# Altium schematic symbol library LATTICEPLDS_Library.SchLib: 291 symbols (part 28 of 32)
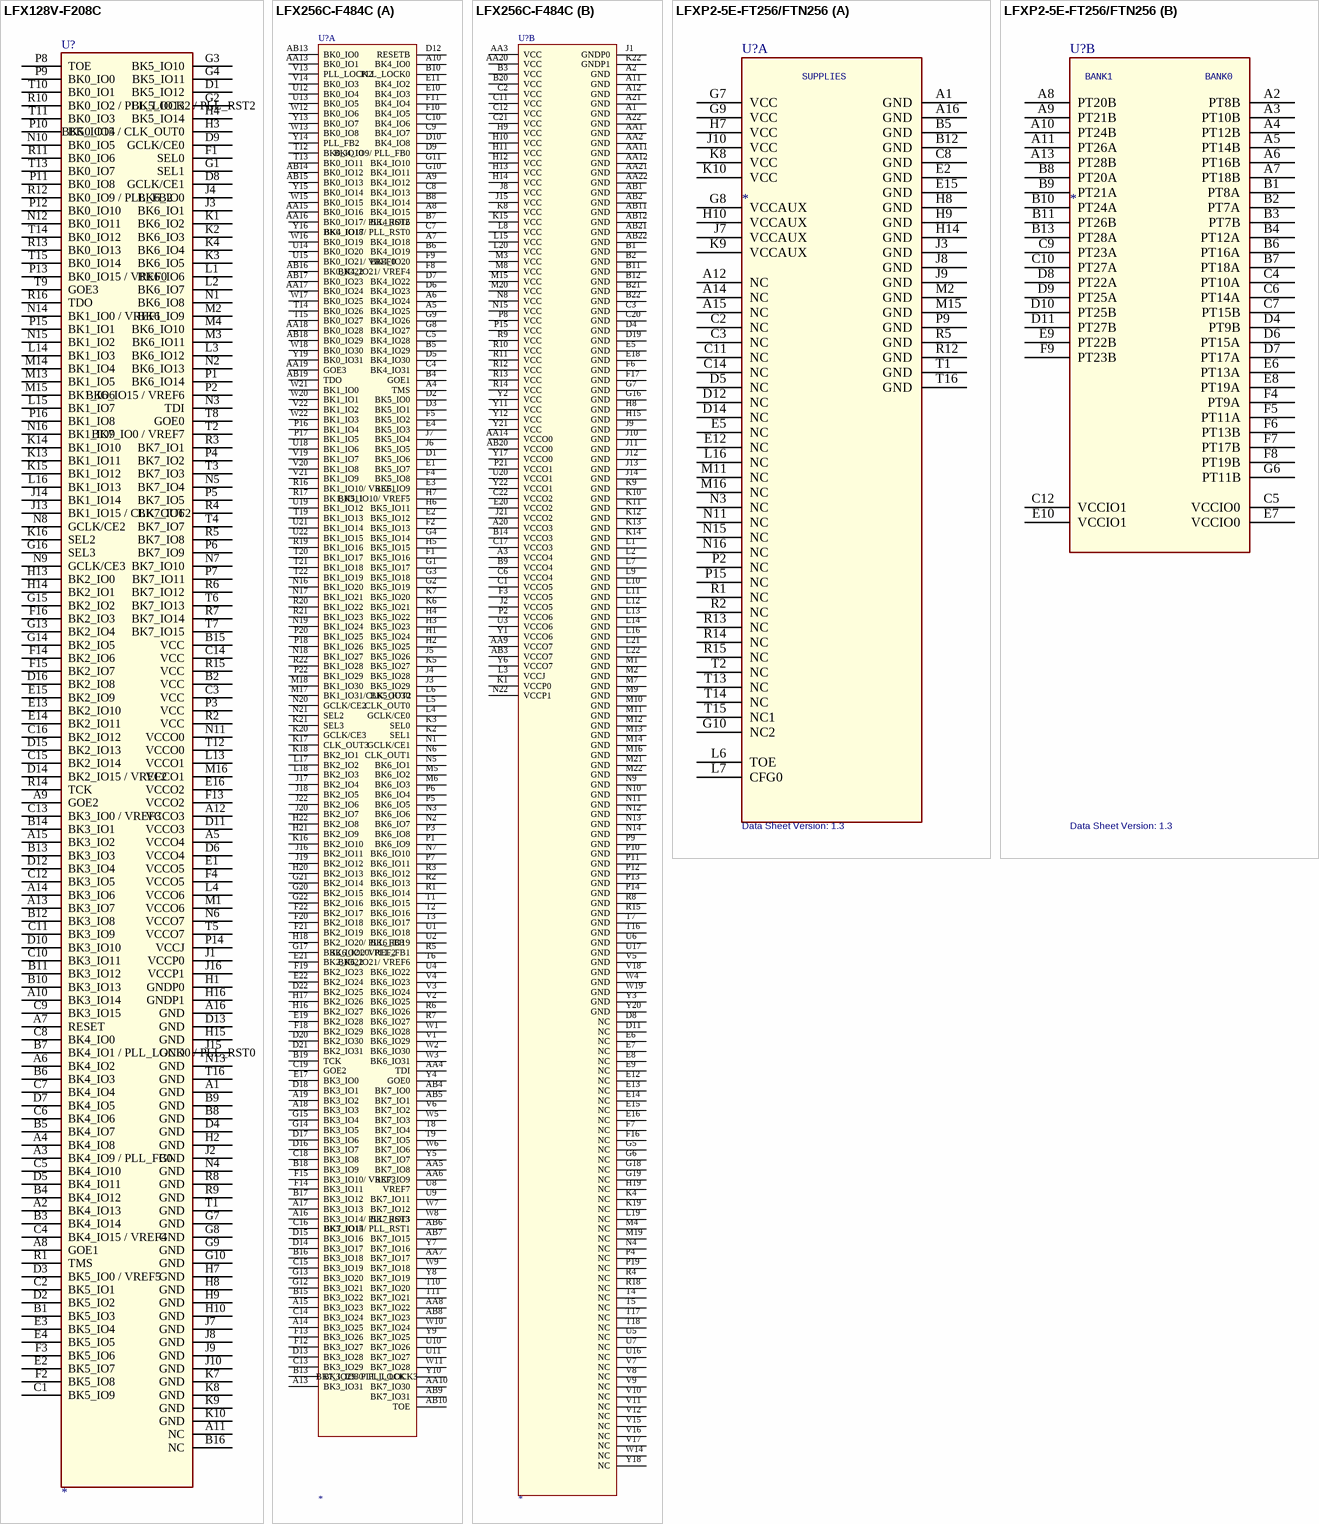
[diagram p330: symbols LFX128V-F208C to LFXP2-5E-FT256/FTN256]

## LFX256C-F484C
designator U?
SPLIT_INST: TRUE; SWAP_INFO: (S1+S2)
part A pins: A4 TMS, A5 BK4_IO25, A6 BK4_IO24, A7 BK4_IO18, A8 BK4_IO15, A9 BK4_IO12, A10 BK4_IO0, A13 BK3_IO31, A14 BK3_IO25, A15 BK3_IO23, A16 BK3_IO14/ PLL_RST3, A17 BK3_IO13, A18 BK3_IO3, A19 BK3_IO2, AA4 TDI, AA5 BK7_IO8, AA6 BK7_IO9, AA7 BK7_IO17, AA8 BK7_IO22, AA10 BK7_IO30, AA13 BK0_IO1, AA15 BK0_IO16, AA16 BK0_IO17/ PLL_RST2, AA17 BK0_IO24, AA18 BK0_IO28, AA19 GOE3, AB4 BK7_IO0, AB5 BK7_IO1, AB6 BK7_IO14/ PLL_RST1, AB7 BK7_IO15, AB8 BK7_IO23, AB9 BK7_IO31, AB10 TOE, AB13 BK0_IO0, AB14 BK0_IO12, AB15 BK0_IO13, AB16 BK0_IO22, AB17 BK0_IO23, AB18 BK0_IO29, AB19 TDO, B4 GOE1, B5 BK4_IO29, B6 BK4_IO19, B7 BK4_IO16, B8 BK4_IO14, B10 PLL_LOCK0, B13 BK3_IO30/ PLL_LOCK3, B15 BK3_IO22, B16 BK3_IO18, B17 BK3_IO12, B18 BK3_IO9, B19 TCK, C4 BK4_IO31, C5 BK4_IO28, C7 BK4_IO17/ PLL_RST0, C8 BK4_IO13, C9 BK4_IO7, C10 BK4_IO6, C13 BK3_IO29, C14 BK3_IO24, C15 BK3_IO19, C16 BK3_IO15, C18 BK3_IO8, C19 GOE2, D1 BK5_IO6, D2 BK5_IO0, D3 BK5_IO1, D5 BK4_IO30, D6 BK4_IO23, D7 BK4_IO22, D9 BK4_IO9/ PLL_FB0, D10 BK4_IO8, D12 RESETB, D13 BK3_IO28, D14 BK3_IO17, D15 BK3_IO16, D16 BK3_IO7, D17 BK3_IO6, D18 BK3_IO1, D20 BK2_IO30, D21 BK2_IO31, D22 BK2_IO25, E1 BK5_IO7, E2 BK5_IO12, E3 BK5_IO9, E4 BK5_IO3, E10 BK4_IO3, E11 BK4_IO2, E17 BK3_IO0, E19 BK2_IO28, E21 BK2_IO22, E22 BK2_IO24, F1 BK5_IO16, F2 BK5_IO13, F4 BK5_IO8, F5 BK5_IO2, F8 BK4_IO21/ VREF4, F9 BK4_IO20, F10 BK4_IO5, F11 BK4_IO4, F12 BK3_IO27, F13 BK3_IO26, F14 BK3_IO11, F15 BK3_IO10/ VREF3, F18 BK2_IO29, F19 BK2_IO23, F20 BK2_IO18, F21 BK2_IO19, F22 BK2_IO17, G1 BK5_IO17, G2 BK5_IO19, G3 BK5_IO18, G4 BK5_IO14, G8 BK4_IO27, G9 BK4_IO26, G10 BK4_IO11, G11 BK4_IO10, G12 BK3_IO21, G13 BK3_IO20, G14 BK3_IO5, G15 BK3_IO4, G17 BK2_IO21/ VREF2, G20 BK2_IO15, G21 BK2_IO14, G22 BK2_IO16, H1 BK5_IO24, H2 BK5_IO25, H3 BK5_IO23, H4 BK5_IO22, H5 BK5_IO15, H6 BK5_IO11, H7 BK5_IO10/ VREF5, H16 BK2_IO27, H17 BK2_IO26, H18 BK2_IO20/ PLL_FB3, H20 BK2_IO13, H21 BK2_IO9, H22 BK2_IO8, J3 BK5_IO29, J4 BK5_IO28, J5 BK5_IO26, J6 BK5_IO5, J7 BK5_IO4, J16 BK2_IO11, J17 BK2_IO4, J18 BK2_IO5, J19 BK2_IO12, J20 BK2_IO7, J22 BK2_IO6, K2 SEL1, K3 SEL0, K5 BK5_IO27, K6 BK5_IO21, K7 BK5_IO20, K16 BK2_IO10, K17 CLK_OUT3, K18 BK2_IO1, K20 GCLK/CE3, K21 SEL3, L4 GCLK/CE0, L5 CLK_OUT0, L6 BK5_IO30, L17 BK2_IO2, L18 BK2_IO3, M5 BK6_IO2, M6 BK6_IO3, M17 BK1_IO31/CLK_OUT2, M18 BK1_IO30, N1 GCLK/CE1, N2 BK6_IO7, N3 BK6_IO6, N5 BK6_IO1, N6 CLK_OUT1, N7 BK6_IO10, N16 BK1_IO20, N17 BK1_IO21, N18 BK1_IO27, N19 BK1_IO24, N20 GCLK/CE2, N21 SEL2, P1 BK6_IO9, P3 BK6_IO8, P5 BK6_IO5, P6 BK6_IO4, P7 BK6_IO11, P16 BK1_IO4, P17 BK1_IO5, P18 BK1_IO26, P20 BK1_IO25, P22 BK1_IO29, R1 BK6_IO14, R2 BK6_IO13, R3 BK6_IO12, R5 BK6_IO20/ PLL_FB1, R6 BK6_IO26, R7 BK6_IO27, R16 BK1_IO10/ VREF1, R17 BK1_IO11, R19 BK1_IO16, R20 BK1_IO22, R21 BK1_IO23, R22 BK1_IO28, T1 BK6_IO15, T2 BK6_IO16, T3 BK6_IO17, T6 BK6_IO21/ VREF6, T8 BK7_IO4, T9 BK7_IO5, T10 BK7_IO20, T11 BK7_IO21, T12 BK0_IO10, T13 BK0_IO11, T14 BK0_IO26, T15 BK0_IO27, T19 BK1_IO13, T20 BK1_IO17, T21 BK1_IO18, T22 BK1_IO19, U1 BK6_IO18, U2 BK6_IO19, U4 BK6_IO22, U8 VREF7, U9 BK7_IO11, U10 BK7_IO26, U11 BK7_IO27, U12 BK0_IO4, U13 BK0_IO5, U14 BK0_IO20, U15 BK0_IO21/ VREF0, U18 BK1_IO6, U19 BK1_IO12, U21 BK1_IO14, U22 BK1_IO15, V1 BK6_IO29, V2 BK6_IO25, V3 BK6_IO24, V4 BK6_IO23, V6 BK7_IO2, V13 PLL_LOCK2, V14 BK0_IO3, V19 BK1_IO7, V20 BK1_IO8, V21 BK1_IO9, V22 BK1_IO2, W1 BK6_IO28, W2 BK6_IO30, W3 BK6_IO31, W5 BK7_IO3, W6 BK7_IO6, W7 BK7_IO12, W8 BK7_IO13, W9 BK7_IO18, W10 BK7_IO24, W11 BK7_IO28, W12 BK0_IO6, W13 BK0_IO8, W15 BK0_IO15, W16 BK0_IO19, W17 BK0_IO25, W18 BK0_IO30, W20 BK1_IO1, W21 BK1_IO0, W22 BK1_IO3, Y4 GOE0, Y5 BK7_IO7, Y7 BK7_IO16, Y8 BK7_IO19, Y9 BK7_IO25, Y10 BK7_IO29/ PLL_LOCK1, Y13 BK0_IO7, Y14 PLL_FB2, Y15 BK0_IO14, Y16 BK0_IO18, Y19 BK0_IO31
part B pins: A1 GND (power), A2 GND (power), A3 VCCO4 (power), A11 GND (power), A12 GND (power), A20 VCCO3 (power), A21 GND (power), A22 GND (power), AA1 GND (power), AA2 GND (power), AA3 VCC (power), AA9 VCCO7 (power), AA11 GND (power), AA12 GND (power), AA14 VCCO0 (power), AA20 VCC (power), AA21 GND (power), AA22 GND (power), AB1 GND (power), AB2 GND (power), AB3 VCCO7 (power), AB11 GND (power), AB12 GND (power), AB20 VCCO0 (power), AB21 GND (power), AB22 GND (power), B1 GND (power), B2 GND (power), B3 VCC (power), B9 VCCO4 (power), B11 GND (power), B12 GND (power), B14 VCCO3 (power), B20 VCC (power), B21 GND (power), B22 GND (power), C1 VCCO5 (power), C2 VCC (power), C3 GND (power), C6 VCCO4 (power), C11 VCC (power), C12 VCC (power), C17 VCCO3 (power), C20 GND (power), C21 VCC (power), C22 VCCO2 (power), D4 GND (power), D8 NC, D11 NC, D19 GND (power), E5 GND (power), E6 NC, E7 NC, E8 NC, E9 NC, E12 NC, E13 NC, E14 NC, E15 NC, E16 NC, E18 GND (power), E20 VCCO2 (power), F3 VCCO5 (power), F6 GND (power), F7 NC, F16 NC, F17 GND (power), G5 NC, G6 NC, G7 GND (power), G16 GND (power), G18 NC, G19 NC, H8 GND (power), H9 VCC (power), H10 VCC (power), H11 VCC (power), H12 VCC (power), H13 VCC (power), H14 VCC (power), H15 GND (power), H19 NC, J1 GNDP0 (power), J2 VCCO5 (power), J8 VCC (power), J9 GND (power), J10 GND (power), J11 GND (power), J12 GND (power), J13 GND (power), J14 GND (power), J15 VCC (power), J21 VCCO2 (power), K1 VCCP0 (power), K4 NC, K8 VCC (power), K9 GND (power), K10 GND (power), K11 GND (power), K12 GND (power), K13 GND (power), K14 GND (power), K15 VCC (power), K19 NC, K22 GNDP1 (power), L1 GND (power), L2 GND (power), L3 VCCJ (power), L7 GND (power), L8 VCC (power), L9 GND (power), L10 GND (power), L11 GND (power), L12 GND (power), L13 GND (power), L14 GND (power), L15 VCC (power), L16 GND (power), L19 NC, L20 VCC (power), L21 GND (power), L22 GND (power), M1 GND (power), M2 GND (power), M3 VCC (power), M4 NC, M7 GND (power), M8 VCC (power), M9 GND (power), M10 GND (power), M11 GND (power), M12 GND (power), M13 GND (power), M14 GND (power), M15 VCC (power), M16 GND (power), M19 NC, M20 VCC (power), M21 GND (power), M22 GND (power), N4 NC, N8 VCC (power), N9 GND (power), N10 GND (power), N11 GND (power), N12 GND (power), N13 GND (power), N14 GND (power), N15 VCC (power), N22 VCCP1 (power), P2 VCCO6 (power), P4 NC, P8 VCC (power), P9 GND (power), P10 GND (power), P11 GND (power), P12 GND (power), P13 GND (power), P14 GND (power), P15 VCC (power), P19 NC, P21 VCCO1 (power), R4 NC, R8 GND (power), R9 VCC (power), R10 VCC (power), R11 VCC (power), R12 VCC (power), R13 VCC (power), R14 VCC (power), R15 GND (power), R18 NC, T4 NC, T5 NC, T7 GND (power), T16 GND (power), T17 NC, T18 NC, U3 VCCO6 (power), U5 NC, U6 GND (power), U7 NC, U16 NC, U17 GND (power), U20 VCCO1 (power), V5 GND (power), V7 NC, V8 NC, V9 NC, V10 NC, V11 NC, V12 NC, V15 NC, V16 NC, V17 NC, V18 GND (power), W4 GND (power), W14 NC, W19 GND (power), Y1 VCCO6 (power), Y2 VCC (power), Y3 GND (power), Y6 VCCO7 (power), Y11 VCC (power), Y12 VCC (power), Y17 VCCO0 (power), Y18 NC, Y20 GND (power), Y21 VCC (power), Y22 VCCO1 (power)

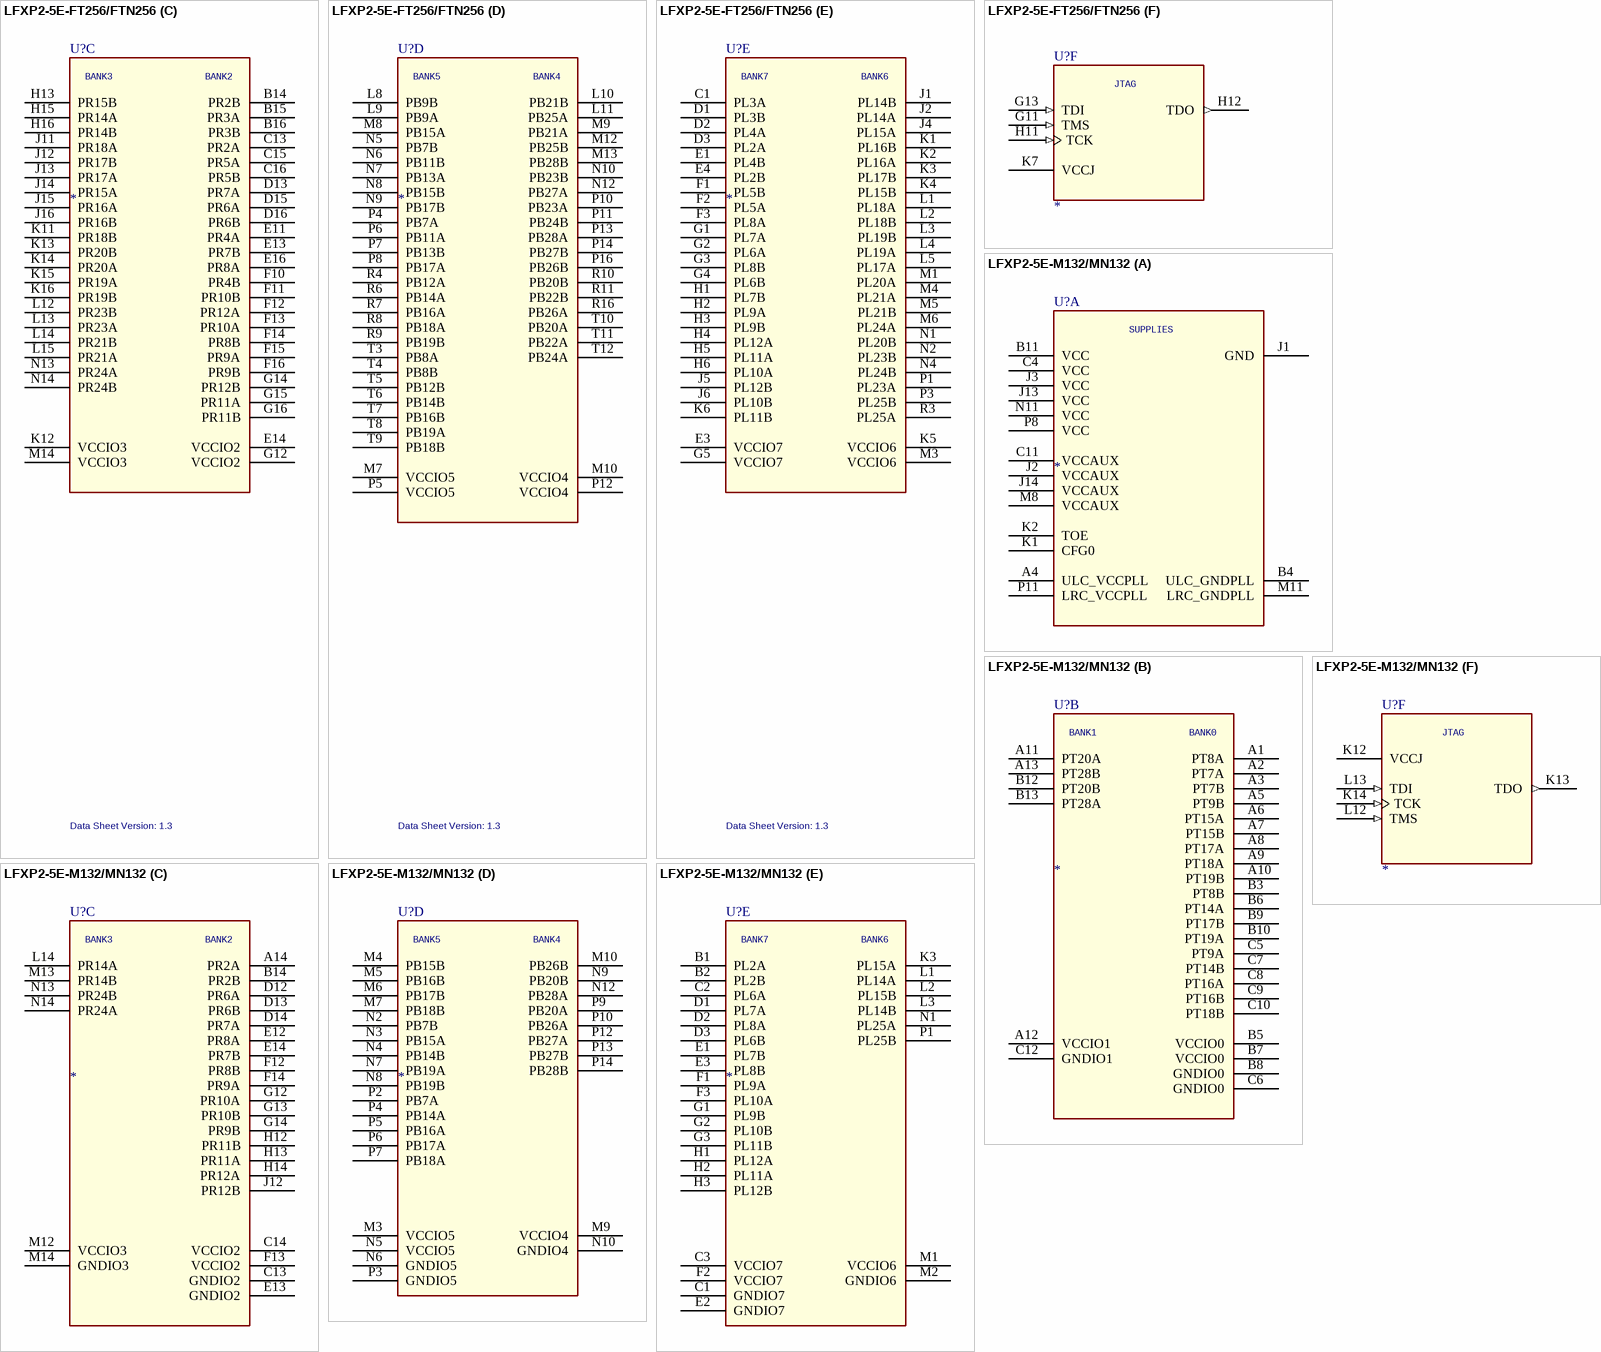
[diagram p250: symbols LFXP2-5E-FT256/FTN256 to LFXP2-5E-M132/MN132]

## LFXP2-5E-FT256/FTN256
designator U?  Data Sheet Version: 1.3
SPLIT_INST: TRUE; SWAP_INFO: (S1+S2+S3+S4+S5+S6)
part A pins: A1 GND (power), A12 NC, A14 NC, A15 NC, A16 GND (power), B5 GND (power), B12 GND (power), C2 NC, C3 NC, C8 GND (power), C11 NC, C14 NC, D5 NC, D12 NC, D14 NC, E2 GND (power), E5 NC, E12 NC, E15 GND (power), G7 VCC (power), G8 VCCAUX (power), G9 VCC (power), G10 NC2, H7 VCC (power), H8 GND (power), H9 GND (power), H10 VCCAUX (power), H14 GND (power), J3 GND (power), J7 VCCAUX (power), J8 GND (power), J9 GND (power), J10 VCC (power), K8 VCC (power), K9 VCCAUX (power), K10 VCC (power), L6 TOE, L7 CFG0, L16 NC, M2 GND (power), M11 NC, M15 GND (power), M16 NC, N3 NC, N11 NC, N15 NC, N16 NC, P2 NC, P9 GND (power), P15 NC, R1 NC, R2 NC, R5 GND (power), R12 GND (power), R13 NC, R14 NC, R15 NC, T1 GND (power), T2 NC, T13 NC, T14 NC, T15 NC1, T16 GND (power)
part B pins: A2 PT8B, A3 PT10B, A4 PT12B, A5 PT14B, A6 PT16B, A7 PT18B, A8 PT20B, A9 PT21B, A10 PT24B, A11 PT26A, A13 PT28B, B1 PT8A, B2 PT7A, B3 PT7B, B4 PT12A, B6 PT16A, B7 PT18A, B8 PT20A, B9 PT21A, B10 PT24A, B11 PT26B, B13 PT28A, C4 PT10A, C5 VCCIO0, C6 PT14A, C7 PT15B, C9 PT23A, C10 PT27A, C12 VCCIO1, D4 PT9B, D6 PT15A, D7 PT17A, D8 PT22A, D9 PT25A, D10 PT25B, D11 PT27B, E6 PT13A, E7 VCCIO0, E8 PT19A, E9 PT22B, E10 VCCIO1, F4 PT9A, F5 PT11A, F6 PT13B, F7 PT17B, F8 PT19B, F9 PT23B, G6 PT11B
part C pins: B14 PR2B, B15 PR3A, B16 PR3B, C13 PR2A, C15 PR5A, C16 PR5B, D13 PR7A, D15 PR6A, D16 PR6B, E11 PR4A, E13 PR7B, E14 VCCIO2, E16 PR8A, F10 PR4B, F11 PR10B, F12 PR12A, F13 PR10A, F14 PR8B, F15 PR9A, F16 PR9B, G12 VCCIO2, G14 PR12B, G15 PR11A, G16 PR11B, H13 PR15B, H15 PR14A, H16 PR14B, J11 PR18A, J12 PR17B, J13 PR17A, J14 PR15A, J15 PR16A, J16 PR16B, K11 PR18B, K12 VCCIO3, K13 PR20B, K14 PR20A, K15 PR19A, K16 PR19B, L12 PR23B, L13 PR23A, L14 PR21B, L15 PR21A, M14 VCCIO3, N13 PR24A, N14 PR24B
part D pins: L8 PB9B, L9 PB9A, L10 PB21B, L11 PB25A, M7 VCCIO5, M8 PB15A, M9 PB21A, M10 VCCIO4, M12 PB25B, M13 PB28B, N5 PB7B, N6 PB11B, N7 PB13A, N8 PB15B, N9 PB17B, N10 PB23B, N12 PB27A, P4 PB7A, P5 VCCIO5, P6 PB11A, P7 PB13B, P8 PB17A, P10 PB23A, P11 PB24B, P12 VCCIO4, P13 PB28A, P14 PB27B, P16 PB26B, R4 PB12A, R6 PB14A, R7 PB16A, R8 PB18A, R9 PB19B, R10 PB20B, R11 PB22B, R16 PB26A, T3 PB8A, T4 PB8B, T5 PB12B, T6 PB14B, T7 PB16B, T8 PB19A, T9 PB18B, T10 PB20A, T11 PB22A, T12 PB24A
part E pins: C1 PL3A, D1 PL3B, D2 PL4A, D3 PL2A, E1 PL4B, E3 VCCIO7, E4 PL2B, F1 PL5B, F2 PL5A, F3 PL8A, G1 PL7A, G2 PL6A, G3 PL8B, G4 PL6B, G5 VCCIO7, H1 PL7B, H2 PL9A, H3 PL9B, H4 PL12A, H5 PL11A, H6 PL10A, J1 PL14B, J2 PL14A, J4 PL15A, J5 PL12B, J6 PL10B, K1 PL16B, K2 PL16A, K3 PL17B, K4 PL15B, K5 VCCIO6, K6 PL11B, L1 PL18A, L2 PL18B, L3 PL19B, L4 PL19A, L5 PL17A, M1 PL20A, M3 VCCIO6, M4 PL21A, M5 PL21B, M6 PL24A, N1 PL20B, N2 PL23B, N4 PL24B, P1 PL23A, P3 PL25B, R3 PL25A
part F pins: G11 TMS (in), G13 TDI (in), H11 TCK (in), H12 TDO (out), K7 VCCJ (power)
part A text: SUPPLIES
part B text: BANK1; BANK0
part C text: BANK3; BANK2
part D text: BANK5; BANK4
part E text: BANK7; BANK6
part F text: JTAG

## LFXP2-5E-M132/MN132
designator U?
SPLIT_INST: TRUE; SWAP_INFO: (S1+S2+S3+S4+S5+S6)
part A pins: A4 ULC_VCCPLL (power), B4 ULC_GNDPLL (power), B11 VCC (power), C4 VCC (power), C11 VCCAUX (power), J1 GND (power), J2 VCCAUX (power), J3 VCC (power), J13 VCC (power), J14 VCCAUX (power), K1 CFG0, K2 TOE, M8 VCCAUX (power), M11 LRC_GNDPLL (power), N11 VCC (power), P8 VCC (power), P11 LRC_VCCPLL (power)
part B pins: A1 PT8A, A2 PT7A, A3 PT7B, A5 PT9B, A6 PT15A, A7 PT15B, A8 PT17A, A9 PT18A, A10 PT19B, A11 PT20A, A12 VCCIO1, A13 PT28B, B3 PT8B, B5 VCCIO0, B6 PT14A, B7 VCCIO0, B8 GNDIO0 (power), B9 PT17B, B10 PT19A, B12 PT20B, B13 PT28A, C5 PT9A, C6 GNDIO0 (power), C7 PT14B, C8 PT16A, C9 PT16B, C10 PT18B, C12 GNDIO1 (power)
part C pins: A14 PR2A, B14 PR2B, C13 GNDIO2 (power), C14 VCCIO2, D12 PR6A, D13 PR6B, D14 PR7A, E12 PR8A, E13 GNDIO2 (power), E14 PR7B, F12 PR8B, F13 VCCIO2, F14 PR9A, G12 PR10A, G13 PR10B, G14 PR9B, H12 PR11B, H13 PR11A, H14 PR12A, J12 PR12B, L14 PR14A, M12 VCCIO3, M13 PR14B, M14 GNDIO3 (power), N13 PR24B, N14 PR24A
part D pins: M3 VCCIO5, M4 PB15B, M5 PB16B, M6 PB17B, M7 PB18B, M9 VCCIO4, M10 PB26B, N2 PB7B, N3 PB15A, N4 PB14B, N5 VCCIO5, N6 GNDIO5 (power), N7 PB19A, N8 PB19B, N9 PB20B, N10 GNDIO4 (power), N12 PB28A, P2 PB7A, P3 GNDIO5 (power), P4 PB14A, P5 PB16A, P6 PB17A, P7 PB18A, P9 PB20A, P10 PB26A, P12 PB27A, P13 PB27B, P14 PB28B
part E pins: B1 PL2A, B2 PL2B, C1 GNDIO7 (power), C2 PL6A, C3 VCCIO7, D1 PL7A, D2 PL8A, D3 PL6B, E1 PL7B, E2 GNDIO7 (power), E3 PL8B, F1 PL9A, F2 VCCIO7, F3 PL10A, G1 PL9B, G2 PL10B, G3 PL11B, H1 PL12A, H2 PL11A, H3 PL12B, K3 PL15A, L1 PL14A, L2 PL15B, L3 PL14B, M1 VCCIO6, M2 GNDIO6 (power), N1 PL25A, P1 PL25B
part F pins: K12 VCCJ (power), K13 TDO (out), K14 TCK (in), L12 TMS (in), L13 TDI (in)
part A text: SUPPLIES
part B text: BANK1; BANK0
part C text: BANK3; BANK2
part D text: BANK5; BANK4
part E text: BANK7; BANK6
part F text: JTAG

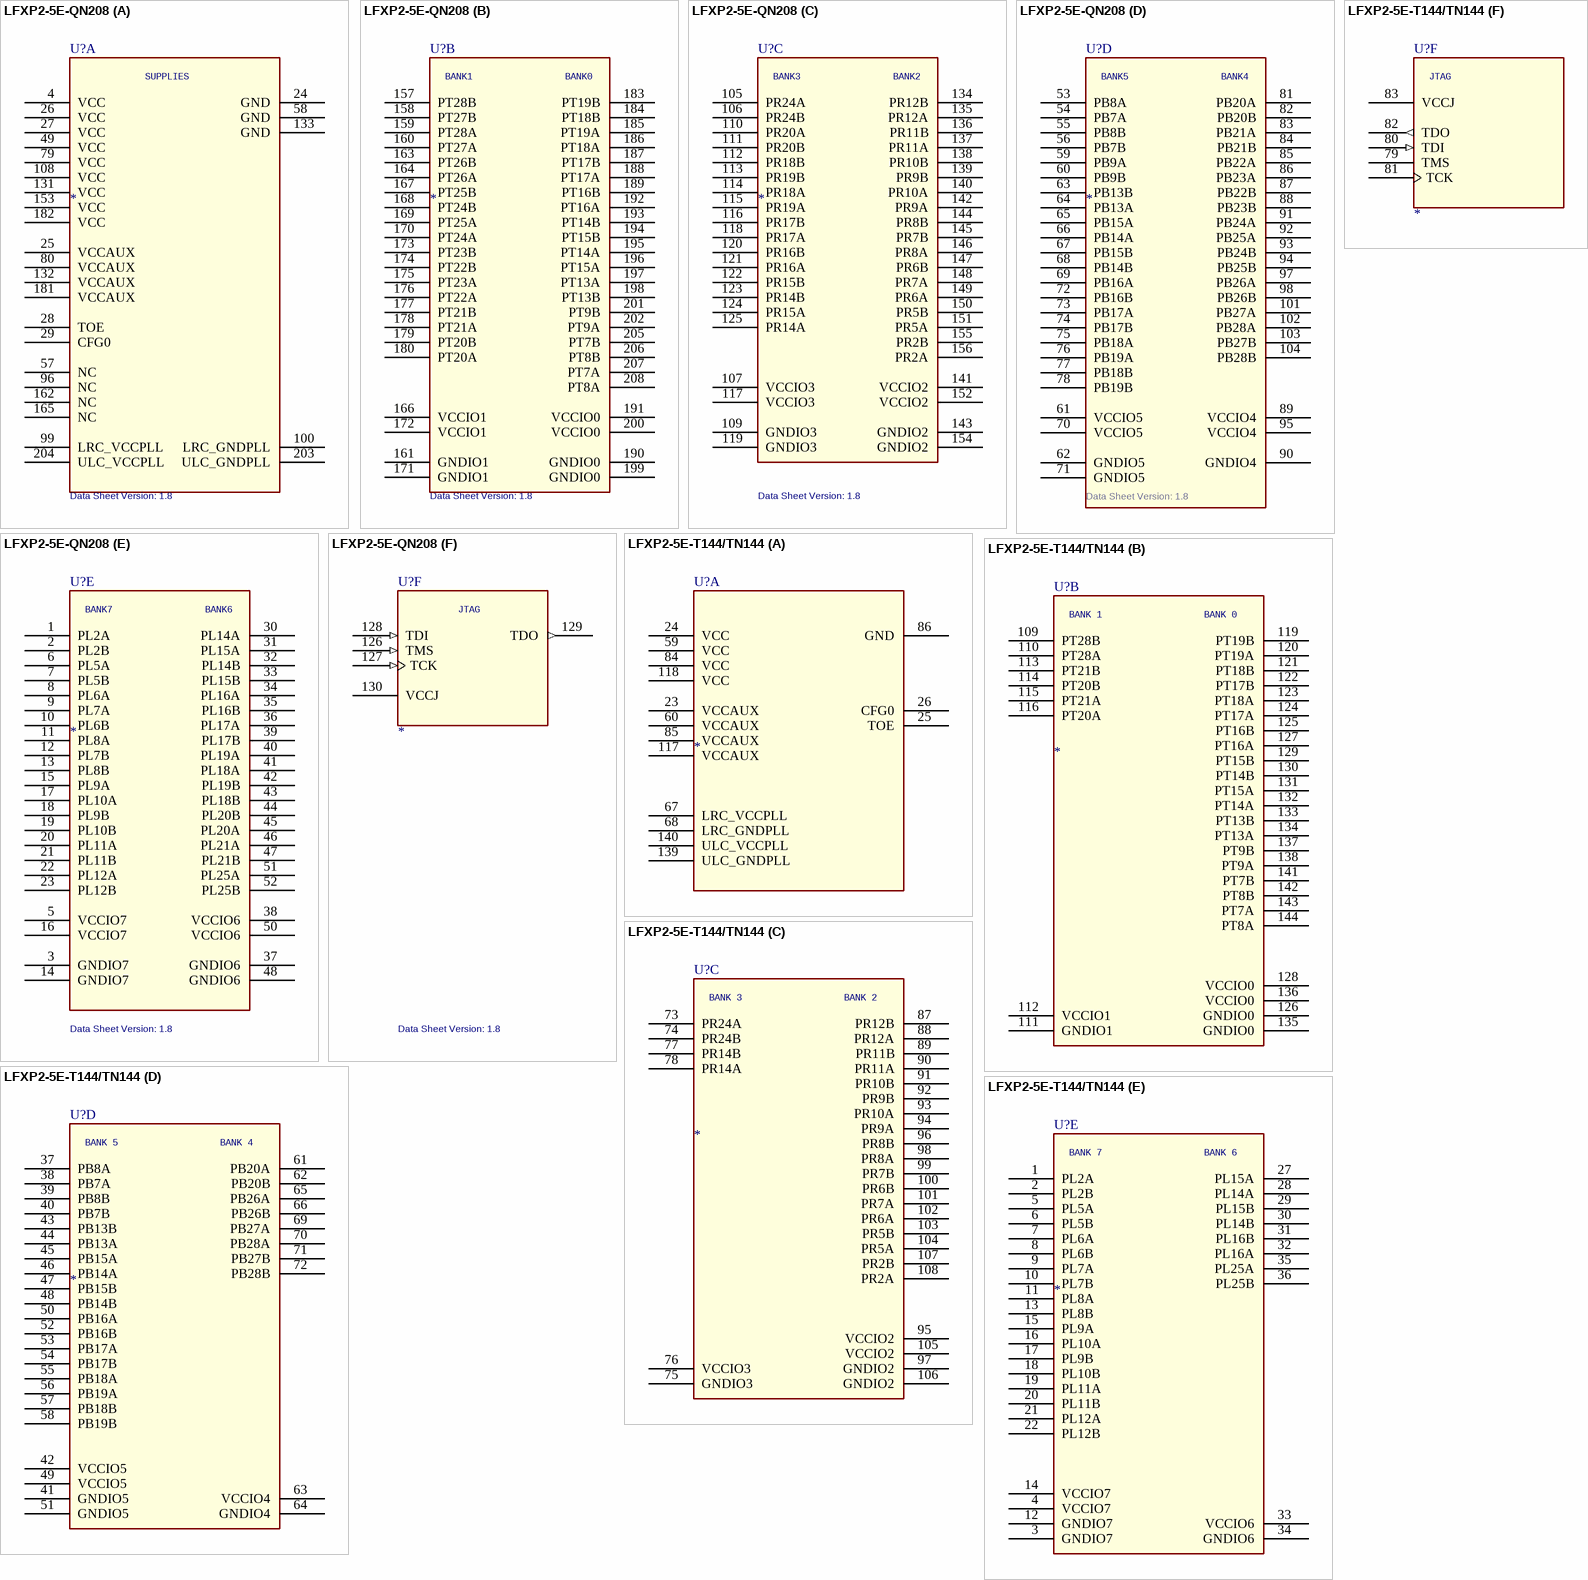
[diagram p251: symbols LFXP2-5E-QN208 to LFXP2-5E-T144/TN144]

## LFXP2-5E-QN208
designator U?  Data Sheet Version: 1.8
SWAP_INFO: (S1+S2+S3+S4+S5+S6); SPLIT_INST: TRUE
part A pins: 4 VCC (power), 24 GND (power), 25 VCCAUX (power), 26 VCC (power), 27 VCC (power), 28 TOE, 29 CFG0, 49 VCC (power), 57 NC, 58 GND (power), 79 VCC (power), 80 VCCAUX (power), 96 NC, 99 LRC_VCCPLL (power), 100 LRC_GNDPLL (power), 108 VCC (power), 131 VCC (power), 132 VCCAUX (power), 133 GND (power), 153 VCC (power), 162 NC, 165 NC, 181 VCCAUX (power), 182 VCC (power), 203 ULC_GNDPLL (power), 204 ULC_VCCPLL (power)
part B pins: 157 PT28B, 158 PT27B, 159 PT28A, 160 PT27A, 161 GNDIO1 (power), 163 PT26B, 164 PT26A, 166 VCCIO1, 167 PT25B, 168 PT24B, 169 PT25A, 170 PT24A, 171 GNDIO1 (power), 172 VCCIO1, 173 PT23B, 174 PT22B, 175 PT23A, 176 PT22A, 177 PT21B, 178 PT21A, 179 PT20B, 180 PT20A, 183 PT19B, 184 PT18B, 185 PT19A, 186 PT18A, 187 PT17B, 188 PT17A, 189 PT16B, 190 GNDIO0 (power), 191 VCCIO0, 192 PT16A, 193 PT14B, 194 PT15B, 195 PT14A, 196 PT15A, 197 PT13A, 198 PT13B, 199 GNDIO0 (power), 200 VCCIO0, 201 PT9B, 202 PT9A, 205 PT7B, 206 PT8B, 207 PT7A, 208 PT8A
part C pins: 105 PR24A, 106 PR24B, 107 VCCIO3, 109 GNDIO3 (power), 110 PR20A, 111 PR20B, 112 PR18B, 113 PR19B, 114 PR18A, 115 PR19A, 116 PR17B, 117 VCCIO3, 118 PR17A, 119 GNDIO3 (power), 120 PR16B, 121 PR16A, 122 PR15B, 123 PR14B, 124 PR15A, 125 PR14A, 134 PR12B, 135 PR12A, 136 PR11B, 137 PR11A, 138 PR10B, 139 PR9B, 140 PR10A, 141 VCCIO2, 142 PR9A, 143 GNDIO2 (power), 144 PR8B, 145 PR7B, 146 PR8A, 147 PR6B, 148 PR7A, 149 PR6A, 150 PR5B, 151 PR5A, 152 VCCIO2, 154 GNDIO2 (power), 155 PR2B, 156 PR2A
part D pins: 53 PB8A, 54 PB7A, 55 PB8B, 56 PB7B, 59 PB9A, 60 PB9B, 61 VCCIO5, 62 GNDIO5 (power), 63 PB13B, 64 PB13A, 65 PB15A, 66 PB14A, 67 PB15B, 68 PB14B, 69 PB16A, 70 VCCIO5, 71 GNDIO5 (power), 72 PB16B, 73 PB17A, 74 PB17B, 75 PB18A, 76 PB19A, 77 PB18B, 78 PB19B, 81 PB20A, 82 PB20B, 83 PB21A, 84 PB21B, 85 PB22A, 86 PB23A, 87 PB22B, 88 PB23B, 89 VCCIO4, 90 GNDIO4 (power), 91 PB24A, 92 PB25A, 93 PB24B, 94 PB25B, 95 VCCIO4, 97 PB26A, 98 PB26B, 101 PB27A, 102 PB28A, 103 PB27B, 104 PB28B
part E pins: 1 PL2A, 2 PL2B, 3 GNDIO7 (power), 5 VCCIO7, 6 PL5A, 7 PL5B, 8 PL6A, 9 PL7A, 10 PL6B, 11 PL8A, 12 PL7B, 13 PL8B, 14 GNDIO7 (power), 15 PL9A, 16 VCCIO7, 17 PL10A, 18 PL9B, 19 PL10B, 20 PL11A, 21 PL11B, 22 PL12A, 23 PL12B, 30 PL14A, 31 PL15A, 32 PL14B, 33 PL15B, 34 PL16A, 35 PL16B, 36 PL17A, 37 GNDIO6 (power), 38 VCCIO6, 39 PL17B, 40 PL19A, 41 PL18A, 42 PL19B, 43 PL18B, 44 PL20B, 45 PL20A, 46 PL21A, 47 PL21B, 48 GNDIO6 (power), 50 VCCIO6, 51 PL25A, 52 PL25B
part F pins: 126 TMS (in), 127 TCK (in), 128 TDI (in), 129 TDO (out), 130 VCCJ (power)
part A text: SUPPLIES
part B text: BANK1; BANK0
part C text: BANK3; BANK2
part D text: BANK5; BANK4
part E text: BANK7; BANK6
part F text: JTAG

## LFXP2-5E-T144/TN144
designator U?
SPLIT_INST: TRUE; SWAP_INFO: (S1+S2+S3+S4+S5+S6)
part A pins: 23 VCCAUX (power), 24 VCC (power), 25 TOE, 26 CFG0, 59 VCC (power), 60 VCCAUX (power), 67 LRC_VCCPLL (power), 68 LRC_GNDPLL (power), 84 VCC (power), 85 VCCAUX (power), 86 GND (power), 117 VCCAUX (power), 118 VCC (power), 139 ULC_GNDPLL (power), 140 ULC_VCCPLL (power)
part B pins: 109 PT28B, 110 PT28A, 111 GNDIO1 (power), 112 VCCIO1, 113 PT21B, 114 PT20B, 115 PT21A, 116 PT20A, 119 PT19B, 120 PT19A, 121 PT18B, 122 PT17B, 123 PT18A, 124 PT17A, 125 PT16B, 126 GNDIO0 (power), 127 PT16A, 128 VCCIO0, 129 PT15B, 130 PT14B, 131 PT15A, 132 PT14A, 133 PT13B, 134 PT13A, 135 GNDIO0 (power), 136 VCCIO0, 137 PT9B, 138 PT9A, 141 PT7B, 142 PT8B, 143 PT7A, 144 PT8A
part C pins: 73 PR24A, 74 PR24B, 75 GNDIO3 (power), 76 VCCIO3, 77 PR14B, 78 PR14A, 87 PR12B, 88 PR12A, 89 PR11B, 90 PR11A, 91 PR10B, 92 PR9B, 93 PR10A, 94 PR9A, 95 VCCIO2, 96 PR8B, 97 GNDIO2 (power), 98 PR8A, 99 PR7B, 100 PR6B, 101 PR7A, 102 PR6A, 103 PR5B, 104 PR5A, 105 VCCIO2, 106 GNDIO2 (power), 107 PR2B, 108 PR2A
part D pins: 37 PB8A, 38 PB7A, 39 PB8B, 40 PB7B, 41 GNDIO5 (power), 42 VCCIO5, 43 PB13B, 44 PB13A, 45 PB15A, 46 PB14A, 47 PB15B, 48 PB14B, 49 VCCIO5, 50 PB16A, 51 GNDIO5 (power), 52 PB16B, 53 PB17A, 54 PB17B, 55 PB18A, 56 PB19A, 57 PB18B, 58 PB19B, 61 PB20A, 62 PB20B, 63 VCCIO4, 64 GNDIO4 (power), 65 PB26A, 66 PB26B, 69 PB27A, 70 PB28A, 71 PB27B, 72 PB28B
part E pins: 1 PL2A, 2 PL2B, 3 GNDIO7 (power), 4 VCCIO7, 5 PL5A, 6 PL5B, 7 PL6A, 8 PL6B, 9 PL7A, 10 PL7B, 11 PL8A, 12 GNDIO7 (power), 13 PL8B, 14 VCCIO7, 15 PL9A, 16 PL10A, 17 PL9B, 18 PL10B, 19 PL11A, 20 PL11B, 21 PL12A, 22 PL12B, 27 PL15A, 28 PL14A, 29 PL15B, 30 PL14B, 31 PL16B, 32 PL16A, 33 VCCIO6, 34 GNDIO6 (power), 35 PL25A, 36 PL25B
part F pins: 79 TMS, 80 TDI (in), 81 TCK, 82 TDO (out), 83 VCCJ
